# Altium footprint library micro-intel.PCBLIB: 48 footprints (part 3 of 4)
Each footprint in its own frame and in the unit in brackets; x right, y up, seen from the top. Pads: shape width x height; smd on the part's side, far side on the other; paste and mask are expansions set on the pad; w line width, h text height; cw(c..) or ccw(c..) is an arc to the next point about the centre after c.
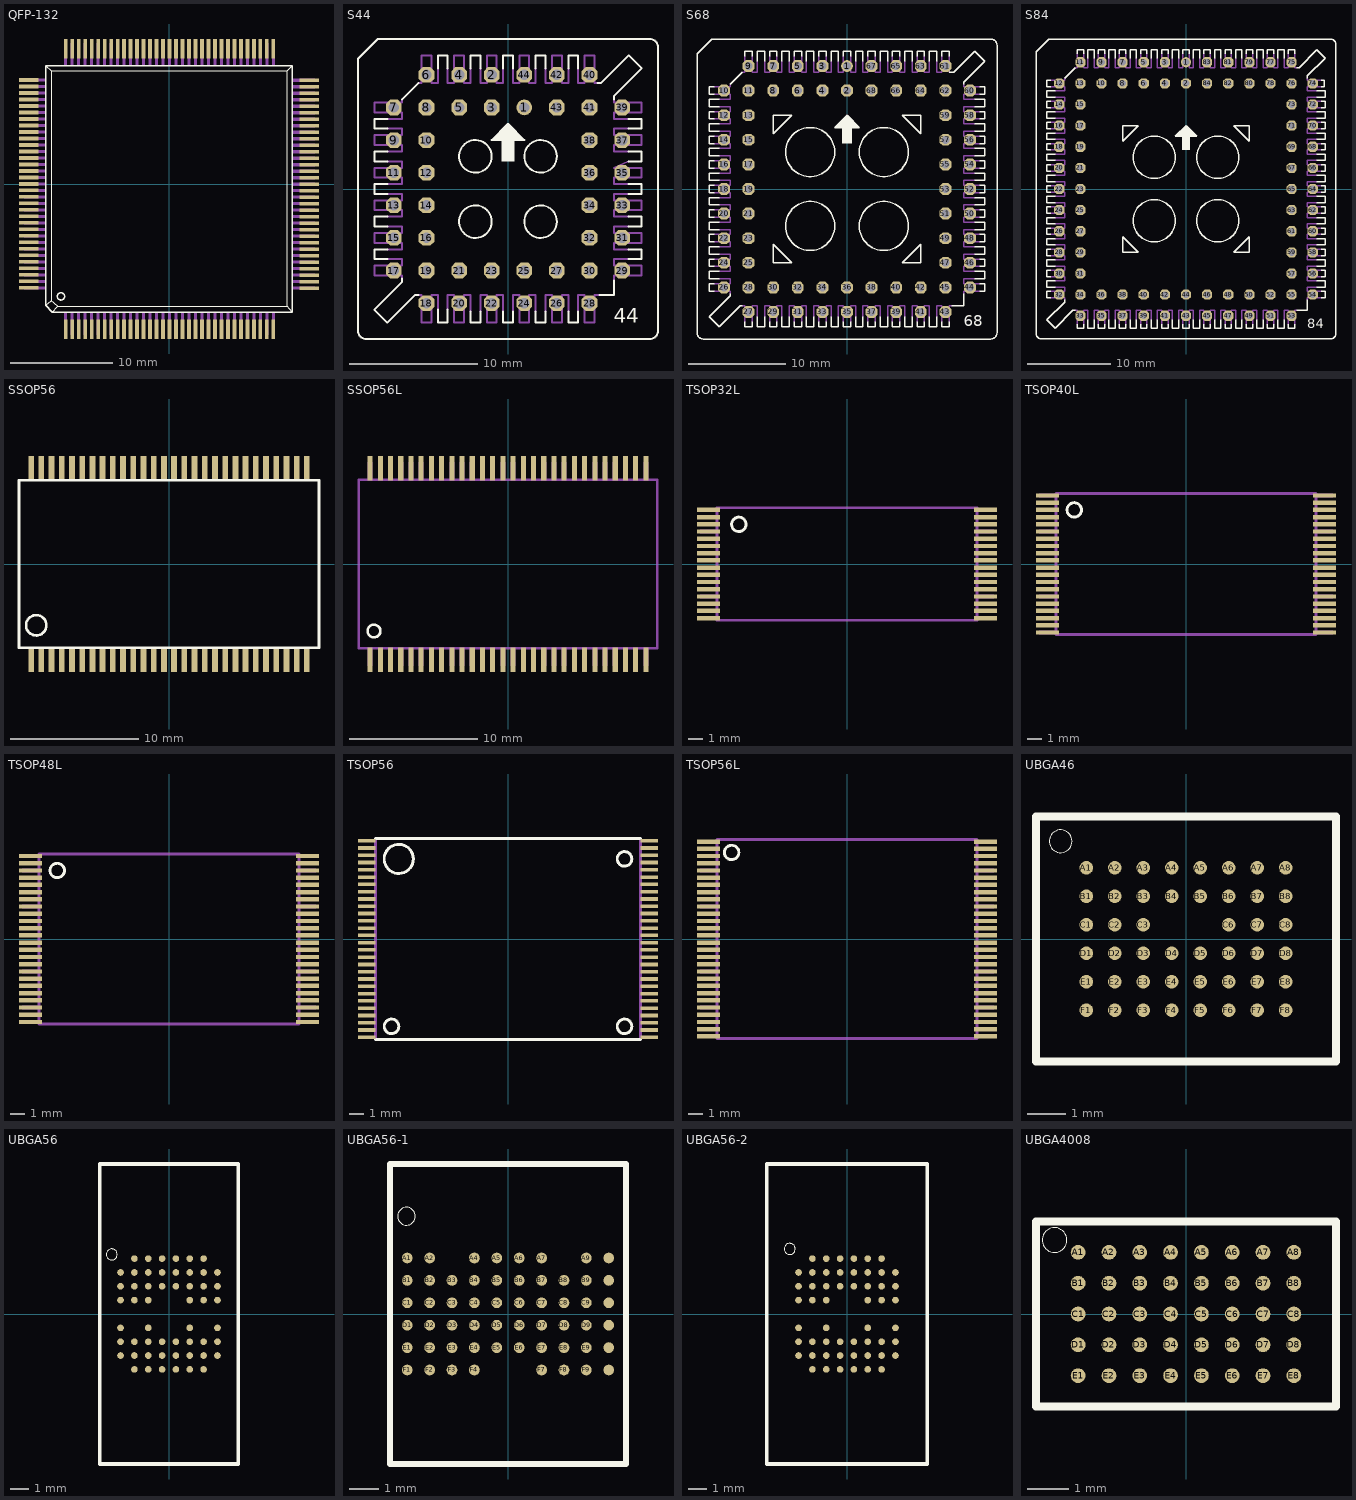
[diagram p2: the footprints below, top view; thin cyan lines are the x and y axes]

## QFP-132 [mil]
pads (132):
  rect 14x75 smd: 1(-399,-557) 2(-374,-557) 3(-349,-557) 4(-324,-557) 5(-299,-557) 6(-274,-557) 7(-249,-557) 8(-224,-557) 9(-199,-557) 10(-174,-557) 11(-149,-557) 12(-124,-557) 13(-99,-557) 14(-74,-557) 15(-49,-557) 16(-24,-557) 17(1,-557) 18(26,-557) 19(51,-557) 20(76,-557) 21(101,-557) 22(126,-557) 23(151,-557) 24(176,-557) 25(201,-557) 26(226,-557) 27(251,-557) 28(276,-557) 29(301,-557) 30(326,-557) 31(351,-557) 32(376,-557) 33(401,-557) 67(401,522) 68(376,522) 69(351,522) 70(326,522) 71(301,522) 72(276,522) 73(251,522) 74(226,522) 75(201,522) 76(176,522) 77(151,522) 78(126,522) 79(101,522) 80(76,522) 81(51,522) 82(26,522) 83(1,522) 84(-24,522) 85(-49,522) 86(-74,522) 87(-99,522) 88(-124,522) 89(-149,522) 90(-174,522) 91(-199,522) 92(-224,522) 93(-249,522) 94(-274,522) 95(-299,522) 96(-324,522) 97(-349,522) 98(-374,522) 99(-399,522)
  rect 75x14 smd: 34(539,-399) 35(539,-374) 36(539,-349) 37(539,-324) 38(539,-299) 39(539,-274) 40(539,-249) 41(539,-224) 42(539,-199) 43(539,-174) 44(539,-149) 45(539,-124) 46(539,-99) 47(539,-74) 48(539,-49) 49(539,-24) 50(539,1) 51(539,26) 52(539,51) 53(539,76) 54(539,101) 55(539,126) 56(539,151) 57(539,176) 58(539,201) 59(539,226) 60(539,251) 61(539,276) 62(539,301) 63(539,326) 64(539,351) 65(539,376) 66(539,401) 100(-541,402) 101(-541,377) 102(-541,352) 103(-541,327) 104(-541,302) 105(-541,277) 106(-541,252) 107(-541,227) 108(-541,202) 109(-541,177) 110(-541,152) 111(-541,127) 112(-541,102) 113(-541,77) 114(-541,52) 115(-541,27) 116(-541,2) 117(-541,-23) 118(-541,-48) 119(-541,-73) 120(-541,-98) 121(-541,-123) 122(-541,-148) 123(-541,-173) 124(-541,-198) 125(-541,-223) 126(-541,-248) 127(-541,-273) 128(-541,-298) 129(-541,-323) 130(-541,-348) 131(-541,-373) 132(-541,-398)
Top Overlay:
  circle w6: c-417,-431 r14
  lines w2: -475,-465 -454,-448 ; -475,457 -454,437 ; -450,-492 -430,-469 ; 474,-492 455,-469 ; 474,457 455,437 ; -454,-448 -454,437 ; -454,-448 -430,-469 ; -454,437 455,437 ; -430,-469 455,-469 ; 455,-469 455,437
  lines w6: -475,-465 -475,457 474,457 474,-492 -450,-492 -475,-465
Mechanical 16:
  rectangle: 476,395 561,407
  rectangle: 476,370 561,382
  rectangle: 476,345 561,357
  rectangle: 476,320 561,332
  rectangle: 476,295 561,307
  rectangle: 476,270 561,282
  rectangle: 476,245 561,257
  rectangle: 476,220 561,232
  rectangle: 476,195 561,207
  rectangle: 476,170 561,182
  rectangle: 476,145 561,157
  rectangle: 476,120 561,132
  rectangle: 476,95 561,107
  rectangle: 476,70 561,82
  rectangle: 476,45 561,57
  rectangle: 476,20 561,32
  rectangle: 476,-5 561,7
  rectangle: 476,-30 561,-18
  rectangle: 476,-55 561,-43
  rectangle: 476,-80 561,-68
  rectangle: 476,-105 561,-93
  rectangle: 476,-130 561,-118
  rectangle: 476,-155 561,-143
  rectangle: 476,-180 561,-168
  rectangle: 476,-205 561,-193
  rectangle: 476,-230 561,-218
  rectangle: 476,-255 561,-243
  rectangle: 476,-280 561,-268
  rectangle: 476,-305 561,-293
  rectangle: 476,-330 561,-318
  rectangle: 476,-355 561,-343
  rectangle: 476,-380 561,-368
  rectangle: 476,-405 561,-393
  rectangle: 320,459 332,544
  rectangle: 295,459 307,544
  rectangle: 270,459 282,544
  rectangle: 245,459 257,544
  rectangle: 220,459 232,544
  rectangle: 195,459 207,544
  rectangle: 170,459 182,544
  rectangle: 145,459 157,544
  rectangle: 120,459 132,544
  rectangle: 95,459 107,544
  rectangle: 70,459 82,544
  rectangle: 45,459 57,544
  rectangle: 20,459 32,544
  rectangle: -5,459 7,544
  rectangle: -30,459 -18,544
  rectangle: -55,459 -43,544
  rectangle: -80,459 -68,544
  rectangle: -105,459 -93,544
  rectangle: -130,459 -118,544
  rectangle: -155,459 -143,544
  rectangle: -180,459 -168,544
  rectangle: -205,459 -193,544
  rectangle: -230,459 -218,544
  rectangle: -255,459 -243,544
  rectangle: -280,459 -268,544
  rectangle: -305,459 -293,544
  rectangle: -330,459 -318,544
  rectangle: -355,459 -343,544
  rectangle: -380,459 -368,544
  rectangle: -405,459 -393,544
  rectangle: 345,459 357,544
  rectangle: 370,459 382,544
  rectangle: 395,459 407,544
  rectangle: -562,396 -477,408
  rectangle: -562,371 -477,383
  rectangle: -562,346 -477,358
  rectangle: -562,321 -477,333
  rectangle: -562,296 -477,308
  rectangle: -562,271 -477,283
  rectangle: -562,246 -477,258
  rectangle: -562,221 -477,233
  rectangle: -562,196 -477,208
  rectangle: -562,171 -477,183
  rectangle: -562,146 -477,158
  rectangle: -562,121 -477,133
  rectangle: -562,96 -477,108
  rectangle: -562,71 -477,83
  rectangle: -562,46 -477,58
  rectangle: -562,21 -477,33
  rectangle: -562,-4 -477,8
  rectangle: -562,-29 -477,-17
  rectangle: -562,-54 -477,-42
  rectangle: -562,-79 -477,-67
  rectangle: -562,-104 -477,-92
  rectangle: -562,-129 -477,-117
  rectangle: -562,-154 -477,-142
  rectangle: -562,-179 -477,-167
  rectangle: -562,-204 -477,-192
  rectangle: -562,-229 -477,-217
  rectangle: -562,-254 -477,-242
  rectangle: -562,-279 -477,-267
  rectangle: -562,-304 -477,-292
  rectangle: -562,-329 -477,-317
  rectangle: -562,-354 -477,-342
  rectangle: -562,-379 -477,-367
  rectangle: -562,-404 -477,-392
  rectangle: 395,-579 407,-494
  rectangle: 370,-579 382,-494
  rectangle: 345,-579 357,-494
  rectangle: 320,-579 332,-494
  rectangle: 295,-579 307,-494
  rectangle: 270,-579 282,-494
  rectangle: 245,-579 257,-494
  rectangle: 220,-579 232,-494
  rectangle: 195,-579 207,-494
  rectangle: 170,-579 182,-494
  rectangle: 145,-579 157,-494
  rectangle: 120,-579 132,-494
  rectangle: 95,-579 107,-494
  rectangle: 70,-579 82,-494
  rectangle: 45,-579 57,-494
  rectangle: 20,-579 32,-494
  rectangle: -5,-579 7,-494
  rectangle: -30,-579 -18,-494
  rectangle: -55,-579 -43,-494
  rectangle: -80,-579 -68,-494
  rectangle: -105,-579 -93,-494
  rectangle: -130,-579 -118,-494
  rectangle: -155,-579 -143,-494
  rectangle: -180,-579 -168,-494
  rectangle: -205,-579 -193,-494
  rectangle: -230,-579 -218,-494
  rectangle: -255,-579 -243,-494
  rectangle: -280,-579 -268,-494
  rectangle: -305,-579 -293,-494
  rectangle: -330,-579 -318,-494
  rectangle: -355,-579 -343,-494
  rectangle: -380,-579 -368,-494
  rectangle: -405,-579 -393,-494

## S44 [mil]
pads (44):
  round 48 hole 32: 1(50,250)
  oct 48x48 hole 32: 2(-50,350) 3(-50,250) 4(-150,350) 5(-150,250) 6(-250,350) 7(-350,250) 8(-250,250) 9(-350,150) 10(-250,150) 11(-350,50) 12(-250,50) 13(-350,-50) 14(-250,-50) 15(-350,-150) 16(-250,-150) 17(-350,-250) 18(-250,-350) 19(-250,-250) 20(-150,-350) 21(-150,-250) 22(-50,-350) 23(-50,-250) 24(50,-350) 25(50,-250) 26(150,-350) 27(150,-250) 28(250,-350) 29(350,-250) 30(250,-250) 31(350,-150) 32(250,-150) 33(350,-50) 34(250,-50) 35(350,50) 36(250,50) 37(350,150) 38(250,150) 39(350,250) 40(250,350) 41(250,250) 42(150,350) 43(150,250) 44(50,350)
Top Overlay:
  circle w6: c-100,100 r50
  circle w6: c100,100 r50
  circle w6: c-100,-100 r50
  circle w6: c100,-100 r50
  rectangle: -20,85 20,160
  rectangle: -35,150 35,165
  rectangle: -25,165 25,175
  rectangle: -15,175 15,185
  rectangle: -5,185 5,195
  rectangle: -45,150 -35,155
  rectangle: -40,155 -35,160
  rectangle: -30,165 -25,170
  rectangle: -20,175 -15,180
  rectangle: -10,185 -5,190
  rectangle: 5,185 10,190
  rectangle: 15,175 20,180
  rectangle: 25,165 30,170
  rectangle: 35,150 45,155
  rectangle: 35,155 40,160
  lines w6: -370,-215 -410,-215 -410,-185 -370,-185 ; -370,-115 -410,-115 -410,-85 -370,-85 ; -370,-15 -410,-15 -410,15 -370,15 ; -370,85 -410,85 -410,115 -370,115 ; -370,185 -410,185 -410,215 -370,215 ; -325,-275 -325,-285 -410,-370 -370,-410 -285,-325 -275,-325 ; -325,275 -275,325 ; -215,-370 -215,-410 -185,-410 -185,-370 ; -215,370 -215,410 -185,410 -185,370 ; -115,-375 -115,-410 -85,-410 -85,-375 ; -115,370 -115,410 -85,410 -85,370 ; -15,-375 -15,-410 15,-410 15,-375 ; -15,370 -15,410 15,410 15,370 ; 85,-375 85,-410 115,-410 115,-375 ; 85,370 85,410 115,410 115,370 ; 185,-375 185,-410 215,-410 215,-375 ; 185,370 185,410 215,410 215,370 ; 275,325 285,325 370,410 410,370 325,285 325,275 ; 280,-325 325,-325 325,-280 ; 370,-215 410,-215 410,-185 370,-185 ; 370,-115 410,-115 410,-85 370,-85 ; 370,-15 410,-15 410,15 370,15 ; 370,85 410,85 410,115 370,115 ; 370,185 410,185 410,215 370,215 ; -460,-435 -460,400 -400,460 435,460 cw(c435,435) 460,435 460,-435 cw(c435,-435) 435,-460 -435,-460 cw(c-435,-435) -460,-435 ; -50,150 50,150 0,200 -50,150
  text "44" at 325,-425 h77.5
Mechanical 16:
  drawing of 159 lines, arcs and shapes, not listed

## S68 [mil]
pads (68):
  round 48 hole 32: 1(0,500)
  oct 48x48 hole 32: 2(0,400) 3(-100,500) 4(-100,400) 5(-200,500) 6(-200,400) 7(-300,500) 8(-300,400) 9(-400,500) 10(-500,400) 11(-400,400) 12(-500,300) 13(-400,300) 14(-500,200) 15(-400,200) 16(-500,100) 17(-400,100) 18(-500,0) 19(-400,0) 20(-500,-100) 21(-400,-100) 22(-500,-200) 23(-400,-200) 24(-500,-300) 25(-400,-300) 26(-500,-400) 27(-400,-500) 28(-400,-400) 29(-300,-500) 30(-300,-400) 31(-200,-500) 32(-200,-400) 33(-100,-500) 34(-100,-400) 35(0,-500) 36(0,-400) 37(100,-500) 38(100,-400) 39(200,-500) 40(200,-400) 41(300,-500) 42(300,-400) 43(400,-500) 44(500,-400) 45(400,-400) 46(500,-300) 47(400,-300) 48(500,-200) 49(400,-200) 50(500,-100) 51(400,-100) 52(500,0) 53(400,0) 54(500,100) 55(400,100) 56(500,200) 57(400,200) 58(500,300) 59(400,300) 60(500,400) 61(400,500) 62(400,400) 63(300,500) 64(300,400) 65(200,500) 66(200,400) 67(100,500) 68(100,400)
Top Overlay:
  drawing of 259 lines, arcs and shapes, not listed
  text "68" at 475,-575 h77.5
Mechanical 16:
  drawing of 207 lines, arcs and shapes, not listed

## S84 [mil]
pads (84):
  round 48 hole 32: 1(0,600)
  oct 48x48 hole 32: 2(0,500) 3(-100,600) 4(-100,500) 5(-200,600) 6(-200,500) 7(-300,600) 8(-300,500) 9(-400,600) 10(-400,500) 11(-500,600) 12(-600,500) 13(-500,500) 14(-600,400) 15(-500,400) 16(-600,300) 17(-500,300) 18(-600,200) 19(-500,200) 20(-600,100) 21(-500,100) 22(-600,0) 23(-500,0) 24(-600,-100) 25(-500,-100) 26(-600,-200) 27(-500,-200) 28(-600,-300) 29(-500,-300) 30(-600,-400) 31(-500,-400) 32(-600,-500) 33(-500,-600) 34(-500,-500) 35(-400,-600) 36(-400,-500) 37(-300,-600) 38(-300,-500) 39(-200,-600) 40(-200,-500) 41(-100,-600) 42(-100,-500) 43(0,-600) 44(0,-500) 45(100,-600) 46(100,-500) 47(200,-600) 48(200,-500) 49(300,-600) 50(300,-500) 51(400,-600) 52(400,-500) 53(500,-600) 54(600,-500) 55(500,-500) 56(600,-400) 57(500,-400) 58(600,-300) 59(500,-300) 60(600,-200) 61(500,-200) 62(600,-100) 63(500,-100) 64(600,0) 65(500,0) 66(600,100) 67(500,100) 68(600,200) 69(500,200) 70(600,300) 71(500,300) 72(600,400) 73(500,400) 74(600,500) 75(500,600) 76(500,500) 77(400,600) 78(400,500) 79(300,600) 80(300,500) 81(200,600) 82(200,500) 83(100,600) 84(100,500)
Top Overlay:
  drawing of 307 lines, arcs and shapes, not listed
  text "84" at 575,-675 h77.5
Mechanical 16:
  drawing of 256 lines, arcs and shapes, not listed

## SSOP56 [mm]
pads (56):
  rect 0.45x1.8 smd: 1(-10.8,-7.55) 2(-10,-7.55) 3(-9.2,-7.55) 4(-8.4,-7.55) 5(-7.6,-7.55) 6(-6.8,-7.55) 7(-6,-7.55) 8(-5.2,-7.55) 9(-4.4,-7.55) 10(-3.6,-7.55) 11(-2.8,-7.55) 12(-2,-7.55) 13(-1.2,-7.55) 14(-0.4,-7.55) 15(0.4,-7.55) 16(1.2,-7.55) 17(2,-7.55) 18(2.8,-7.55) 19(3.6,-7.55) 20(4.4,-7.55) 21(5.2,-7.55) 22(6,-7.55) 23(6.8,-7.55) 24(7.6,-7.55) 25(8.4,-7.55) 26(9.2,-7.55) 27(10,-7.55) 28(10.8,-7.55) 29(10.8,7.55) 30(10,7.55) 31(9.2,7.55) 32(8.4,7.55) 33(7.6,7.55) 34(6.8,7.55) 35(6,7.55) 36(5.2,7.55) 37(4.4,7.55) 38(3.6,7.55) 39(2.8,7.55) 40(2,7.55) 41(1.2,7.55) 42(0.4,7.55) 43(-0.4,7.55) 44(-1.2,7.55) 45(-2,7.55) 46(-2.8,7.55) 47(-3.6,7.55) 48(-4.4,7.55) 49(-5.2,7.55) 50(-6,7.55) 51(-6.8,7.55) 52(-7.6,7.55) 53(-8.4,7.55) 54(-9.2,7.55) 55(-10,7.55) 56(-10.8,7.55)
Top Overlay:
  circle w0.203: c-10.4,-4.8 r0.8
  lines w0.203: -11.75,-6.55 11.75,-6.55 11.75,6.55 -11.75,6.55 -11.75,-6.55
Mechanical 16:
  rectangle: -10.95,-8 -10.65,-6.6
  rectangle: -10.15,-8 -9.85,-6.6
  rectangle: -9.35,-8 -9.05,-6.6
  rectangle: -8.55,-8 -8.25,-6.6
  rectangle: -7.75,-8 -7.45,-6.6
  rectangle: -6.95,-8 -6.65,-6.6
  rectangle: -6.15,-8 -5.85,-6.6
  rectangle: -5.35,-8 -5.05,-6.6
  rectangle: -4.55,-8 -4.25,-6.6
  rectangle: -3.75,-8 -3.45,-6.6
  rectangle: -2.95,-8 -2.65,-6.6
  rectangle: -2.15,-8 -1.85,-6.6
  rectangle: -1.35,-8 -1.05,-6.6
  rectangle: -0.55,-8 -0.25,-6.6
  rectangle: 0.25,-8 0.55,-6.6
  rectangle: 1.05,-8 1.35,-6.6
  rectangle: 1.85,-8 2.15,-6.6
  rectangle: 2.65,-8 2.95,-6.6
  rectangle: 3.45,-8 3.75,-6.6
  rectangle: 4.25,-8 4.55,-6.6
  rectangle: 5.05,-8 5.35,-6.6
  rectangle: 5.85,-8 6.15,-6.6
  rectangle: 6.65,-8 6.95,-6.6
  rectangle: 7.45,-8 7.75,-6.6
  rectangle: 8.25,-8 8.55,-6.6
  rectangle: 9.05,-8 9.35,-6.6
  rectangle: 9.85,-8 10.15,-6.6
  rectangle: 10.65,-8 10.95,-6.6
  rectangle: 10.65,6.6 10.95,8
  rectangle: 9.85,6.6 10.15,8
  rectangle: 9.05,6.6 9.35,8
  rectangle: 8.25,6.6 8.55,8
  rectangle: 7.45,6.6 7.75,8
  rectangle: 6.65,6.6 6.95,8
  rectangle: 5.85,6.6 6.15,8
  rectangle: 5.05,6.6 5.35,8
  rectangle: 4.25,6.6 4.55,8
  rectangle: 3.45,6.6 3.75,8
  rectangle: 2.65,6.6 2.95,8
  rectangle: 1.85,6.6 2.15,8
  rectangle: 1.05,6.6 1.35,8
  rectangle: 0.25,6.6 0.55,8
  rectangle: -0.55,6.6 -0.25,8
  rectangle: -1.35,6.6 -1.05,8
  rectangle: -2.15,6.6 -1.85,8
  rectangle: -2.95,6.6 -2.65,8
  rectangle: -3.75,6.6 -3.45,8
  rectangle: -4.55,6.6 -4.25,8
  rectangle: -5.35,6.6 -5.05,8
  rectangle: -6.15,6.6 -5.85,8
  rectangle: -6.95,6.6 -6.65,8
  rectangle: -7.75,6.6 -7.45,8
  rectangle: -8.55,6.6 -8.25,8
  rectangle: -9.35,6.6 -9.05,8
  rectangle: -10.15,6.6 -9.85,8
  rectangle: -10.95,6.6 -10.65,8

## SSOP56L [mm]
pads (56):
  rect 0.4x1.9 smd: 1(-10.8,-7.5) 2(-10,-7.5) 3(-9.2,-7.5) 4(-8.4,-7.5) 5(-7.6,-7.5) 6(-6.8,-7.5) 7(-6,-7.5) 8(-5.2,-7.5) 9(-4.4,-7.5) 10(-3.6,-7.5) 11(-2.8,-7.5) 12(-2,-7.5) 13(-1.2,-7.5) 14(-0.4,-7.5) 15(0.4,-7.5) 16(1.2,-7.5) 17(2,-7.5) 18(2.8,-7.5) 19(3.6,-7.5) 20(4.4,-7.5) 21(5.2,-7.5) 22(6,-7.5) 23(6.8,-7.5) 24(7.6,-7.5) 25(8.4,-7.5) 26(9.2,-7.5) 27(10,-7.5) 28(10.8,-7.5) 29(10.8,7.5) 30(10,7.5) 31(9.2,7.5) 32(8.4,7.5) 33(7.6,7.5) 34(6.8,7.5) 35(6,7.5) 36(5.2,7.5) 37(4.4,7.5) 38(3.6,7.5) 39(2.8,7.5) 40(2,7.5) 41(1.2,7.5) 42(0.4,7.5) 43(-0.4,7.5) 44(-1.2,7.5) 45(-2,7.5) 46(-2.8,7.5) 47(-3.6,7.5) 48(-4.4,7.5) 49(-5.2,7.5) 50(-6,7.5) 51(-6.8,7.5) 52(-7.6,7.5) 53(-8.4,7.5) 54(-9.2,7.5) 55(-10,7.5) 56(-10.8,7.5)
Top Overlay:
  circle w0.203: c-10.5,-5.25 r0.5
Mechanical 16:
  rectangle: -11,-8 -10.6,-6.6
  rectangle: -10.2,-8 -9.8,-6.6
  rectangle: -9.4,-8 -9,-6.6
  rectangle: -8.6,-8 -8.2,-6.6
  rectangle: -7.8,-8 -7.4,-6.6
  rectangle: -7,-8 -6.6,-6.6
  rectangle: -6.2,-8 -5.8,-6.6
  rectangle: -5.4,-8 -5,-6.6
  rectangle: -4.6,-8 -4.2,-6.6
  rectangle: -3.8,-8 -3.4,-6.6
  rectangle: -3,-8 -2.6,-6.6
  rectangle: -2.2,-8 -1.8,-6.6
  rectangle: -1.4,-8 -1,-6.6
  rectangle: -0.6,-8 -0.2,-6.6
  rectangle: 0.2,-8 0.6,-6.6
  rectangle: 1,-8 1.4,-6.6
  rectangle: 1.8,-8 2.2,-6.6
  rectangle: 2.6,-8 3,-6.6
  rectangle: 3.4,-8 3.8,-6.6
  rectangle: 4.2,-8 4.6,-6.6
  rectangle: 5,-8 5.4,-6.6
  rectangle: 5.8,-8 6.2,-6.6
  rectangle: 6.6,-8 7,-6.6
  rectangle: 7.4,-8 7.8,-6.6
  rectangle: 8.2,-8 8.6,-6.6
  rectangle: 9,-8 9.4,-6.6
  rectangle: 9.8,-8 10.2,-6.6
  rectangle: 10.6,-8 11,-6.6
  rectangle: 10.6,6.6 11,8
  rectangle: 9.8,6.6 10.2,8
  rectangle: 9,6.6 9.4,8
  rectangle: 8.2,6.6 8.6,8
  rectangle: 7.4,6.6 7.8,8
  rectangle: 6.6,6.6 7,8
  rectangle: 5.8,6.6 6.2,8
  rectangle: 5,6.6 5.4,8
  rectangle: 4.2,6.6 4.6,8
  rectangle: 3.4,6.6 3.8,8
  rectangle: 2.6,6.6 3,8
  rectangle: 1.8,6.6 2.2,8
  rectangle: 1,6.6 1.4,8
  rectangle: 0.2,6.6 0.6,8
  rectangle: -0.6,6.6 -0.2,8
  rectangle: -1.4,6.6 -1,8
  rectangle: -2.2,6.6 -1.8,8
  rectangle: -3,6.6 -2.6,8
  rectangle: -3.8,6.6 -3.4,8
  rectangle: -4.6,6.6 -4.2,8
  rectangle: -5.4,6.6 -5,8
  rectangle: -6.2,6.6 -5.8,8
  rectangle: -7,6.6 -6.6,8
  rectangle: -7.8,6.6 -7.4,8
  rectangle: -8.6,6.6 -8.2,8
  rectangle: -9.4,6.6 -9,8
  rectangle: -10.2,6.6 -9.8,8
  rectangle: -11,6.6 -10.6,8
  lines w0.203: -11.7,-6.6 -11.7,6.6 11.7,6.6 11.7,-6.6 -11.7,-6.6

## TSOP32L [mil]
pads (32):
  rect 62.99x11.81 smd: 1(-377.95,147.64) 2(-377.95,127.95) 3(-377.95,108.27) 4(-377.95,88.58) 5(-377.95,68.9) 6(-377.95,49.21) 7(-377.95,29.53) 8(-377.95,9.84) 9(-377.95,-9.84) 10(-377.95,-29.53) 11(-377.95,-49.21) 12(-377.95,-68.9) 13(-377.95,-88.58) 14(-377.95,-108.27) 15(-377.95,-127.95) 16(-377.95,-147.64) 17(377.95,-147.64) 18(377.95,-127.95) 19(377.95,-108.27) 20(377.95,-88.58) 21(377.95,-68.9) 22(377.95,-49.21) 23(377.95,-29.53) 24(377.95,-9.84) 25(377.95,9.84) 26(377.95,29.53) 27(377.95,49.21) 28(377.95,68.9) 29(377.95,88.58) 30(377.95,108.27) 31(377.95,127.95) 32(377.95,147.64)
Top Overlay:
  circle w8: c-295.28,108.27 r19.69
Mechanical 16:
  rectangle: -401.57,142.72 -357.28,152.56
  rectangle: -401.57,123.03 -357.28,132.87
  rectangle: -401.57,103.35 -357.28,113.19
  rectangle: -401.57,83.66 -357.28,93.5
  rectangle: -401.57,63.98 -357.28,73.82
  rectangle: -401.57,44.29 -357.28,54.13
  rectangle: -401.57,24.61 -357.28,34.45
  rectangle: -401.57,4.92 -357.28,14.76
  rectangle: -401.57,-14.76 -357.28,-4.92
  rectangle: -401.57,-34.45 -357.28,-24.61
  rectangle: -401.57,-54.13 -357.28,-44.29
  rectangle: -401.57,-73.82 -357.28,-63.98
  rectangle: -401.57,-93.5 -357.28,-83.66
  rectangle: -401.57,-113.19 -357.28,-103.35
  rectangle: -401.57,-132.87 -357.28,-123.03
  rectangle: -401.57,-152.56 -357.28,-142.72
  rectangle: 357.28,-152.56 401.57,-142.72
  rectangle: 357.28,-132.87 401.57,-123.03
  rectangle: 357.28,-113.19 401.57,-103.35
  rectangle: 357.28,-93.5 401.57,-83.66
  rectangle: 357.28,-73.82 401.57,-63.98
  rectangle: 357.28,-54.13 401.57,-44.29
  rectangle: 357.28,-34.45 401.57,-24.61
  rectangle: 357.28,-14.76 401.57,-4.92
  rectangle: 357.28,4.92 401.57,14.76
  rectangle: 357.28,24.61 401.57,34.45
  rectangle: 357.28,44.29 401.57,54.13
  rectangle: 357.28,63.98 401.57,73.82
  rectangle: 357.28,83.66 401.57,93.5
  rectangle: 357.28,103.35 401.57,113.19
  rectangle: 357.28,123.03 401.57,132.87
  rectangle: 357.28,142.72 401.57,152.56
  lines w8: -354.33,-153.54 354.33,-153.54 354.33,153.54 -354.33,153.54 -354.33,-153.54

## TSOP40L [mil]
pads (40):
  rect 62.99x11.81 smd: 1(-377.95,187.01) 2(-377.95,167.32) 3(-377.95,147.64) 4(-377.95,127.95) 5(-377.95,108.27) 6(-377.95,88.58) 7(-377.95,68.9) 8(-377.95,49.21) 9(-377.95,29.53) 10(-377.95,9.84) 11(-377.95,-9.84) 12(-377.95,-29.53) 13(-377.95,-49.21) 14(-377.95,-68.9) 15(-377.95,-88.58) 16(-377.95,-108.27) 17(-377.95,-127.95) 18(-377.95,-147.64) 19(-377.95,-167.32) 20(-377.95,-187.01) 21(377.95,-187.01) 22(377.95,-167.32) 23(377.95,-147.64) 24(377.95,-127.95) 25(377.95,-108.27) 26(377.95,-88.58) 27(377.95,-68.9) 28(377.95,-49.21) 29(377.95,-29.53) 30(377.95,-9.84) 31(377.95,9.84) 32(377.95,29.53) 33(377.95,49.21) 34(377.95,68.9) 35(377.95,88.58) 36(377.95,108.27) 37(377.95,127.95) 38(377.95,147.64) 39(377.95,167.32) 40(377.95,187.01)
Top Overlay:
  circle w8: c-305.12,147.64 r19.69
Mechanical 16:
  rectangle: -401.57,182.09 -357.28,191.93
  rectangle: -401.57,162.4 -357.28,172.24
  rectangle: -401.57,142.72 -357.28,152.56
  rectangle: -401.57,123.03 -357.28,132.87
  rectangle: -401.57,103.35 -357.28,113.19
  rectangle: -401.57,83.66 -357.28,93.5
  rectangle: -401.57,63.98 -357.28,73.82
  rectangle: -401.57,44.29 -357.28,54.13
  rectangle: -401.57,24.61 -357.28,34.45
  rectangle: -401.57,4.92 -357.28,14.76
  rectangle: -401.57,-14.76 -357.28,-4.92
  rectangle: -401.57,-34.45 -357.28,-24.61
  rectangle: -401.57,-54.13 -357.28,-44.29
  rectangle: -401.57,-73.82 -357.28,-63.98
  rectangle: -401.57,-93.5 -357.28,-83.66
  rectangle: -401.57,-113.19 -357.28,-103.35
  rectangle: -401.57,-132.87 -357.28,-123.03
  rectangle: -401.57,-152.56 -357.28,-142.72
  rectangle: -401.57,-172.24 -357.28,-162.4
  rectangle: -401.57,-191.93 -357.28,-182.09
  rectangle: 357.28,-191.93 401.57,-182.09
  rectangle: 357.28,-172.24 401.57,-162.4
  rectangle: 357.28,-152.56 401.57,-142.72
  rectangle: 357.28,-132.87 401.57,-123.03
  rectangle: 357.28,-113.19 401.57,-103.35
  rectangle: 357.28,-93.5 401.57,-83.66
  rectangle: 357.28,-73.82 401.57,-63.98
  rectangle: 357.28,-54.13 401.57,-44.29
  rectangle: 357.28,-34.45 401.57,-24.61
  rectangle: 357.28,-14.76 401.57,-4.92
  rectangle: 357.28,4.92 401.57,14.76
  rectangle: 357.28,24.61 401.57,34.45
  rectangle: 357.28,44.29 401.57,54.13
  rectangle: 357.28,63.98 401.57,73.82
  rectangle: 357.28,83.66 401.57,93.5
  rectangle: 357.28,103.35 401.57,113.19
  rectangle: 357.28,123.03 401.57,132.87
  rectangle: 357.28,142.72 401.57,152.56
  rectangle: 357.28,162.4 401.57,172.24
  rectangle: 357.28,182.09 401.57,191.93
  lines w8: -354.33,-192.91 354.33,-192.91 354.33,192.91 -354.33,192.91 -354.33,-192.91

## TSOP48L [mil]
pads (48):
  rect 62.99x11.81 smd: 1(-377.95,226.38) 2(-377.95,206.69) 3(-377.95,187.01) 4(-377.95,167.32) 5(-377.95,147.64) 6(-377.95,127.95) 7(-377.95,108.27) 8(-377.95,88.58) 9(-377.95,68.9) 10(-377.95,49.21) 11(-377.95,29.53) 12(-377.95,9.84) 13(-377.95,-9.84) 14(-377.95,-29.53) 15(-377.95,-49.21) 16(-377.95,-68.9) 17(-377.95,-88.58) 18(-377.95,-108.27) 19(-377.95,-127.95) 20(-377.95,-147.64) 21(-377.95,-167.32) 22(-377.95,-187.01) 23(-377.95,-206.69) 24(-377.95,-226.38) 25(377.95,-226.38) 26(377.95,-206.69) 27(377.95,-187.01) 28(377.95,-167.32) 29(377.95,-147.64) 30(377.95,-127.95) 31(377.95,-108.27) 32(377.95,-88.58) 33(377.95,-68.9) 34(377.95,-49.21) 35(377.95,-29.53) 36(377.95,-9.84) 37(377.95,9.84) 38(377.95,29.53) 39(377.95,49.21) 40(377.95,68.9) 41(377.95,88.58) 42(377.95,108.27) 43(377.95,127.95) 44(377.95,147.64) 45(377.95,167.32) 46(377.95,187.01) 47(377.95,206.69) 48(377.95,226.38)
Top Overlay:
  circle w8: c-305.12,187.01 r19.69
Mechanical 16:
  rectangle: -401.57,221.46 -357.28,231.3
  rectangle: -401.57,201.77 -357.28,211.61
  rectangle: -401.57,182.09 -357.28,191.93
  rectangle: -401.57,162.4 -357.28,172.24
  rectangle: -401.57,142.72 -357.28,152.56
  rectangle: -401.57,123.03 -357.28,132.87
  rectangle: -401.57,103.35 -357.28,113.19
  rectangle: -401.57,83.66 -357.28,93.5
  rectangle: -401.57,63.98 -357.28,73.82
  rectangle: -401.57,44.29 -357.28,54.13
  rectangle: -401.57,24.61 -357.28,34.45
  rectangle: -401.57,4.92 -357.28,14.76
  rectangle: -401.57,-14.76 -357.28,-4.92
  rectangle: -401.57,-34.45 -357.28,-24.61
  rectangle: -401.57,-54.13 -357.28,-44.29
  rectangle: -401.57,-73.82 -357.28,-63.98
  rectangle: -401.57,-93.5 -357.28,-83.66
  rectangle: -401.57,-113.19 -357.28,-103.35
  rectangle: -401.57,-132.87 -357.28,-123.03
  rectangle: -401.57,-152.56 -357.28,-142.72
  rectangle: -401.57,-172.24 -357.28,-162.4
  rectangle: -401.57,-191.93 -357.28,-182.09
  rectangle: -401.57,-211.61 -357.28,-201.77
  rectangle: -401.57,-231.3 -357.28,-221.46
  rectangle: 357.28,-231.3 401.57,-221.46
  rectangle: 357.28,-211.61 401.57,-201.77
  rectangle: 357.28,-191.93 401.57,-182.09
  rectangle: 357.28,-172.24 401.57,-162.4
  rectangle: 357.28,-152.56 401.57,-142.72
  rectangle: 357.28,-132.87 401.57,-123.03
  rectangle: 357.28,-113.19 401.57,-103.35
  rectangle: 357.28,-93.5 401.57,-83.66
  rectangle: 357.28,-73.82 401.57,-63.98
  rectangle: 357.28,-54.13 401.57,-44.29
  rectangle: 357.28,-34.45 401.57,-24.61
  rectangle: 357.28,-14.76 401.57,-4.92
  rectangle: 357.28,4.92 401.57,14.76
  rectangle: 357.28,24.61 401.57,34.45
  rectangle: 357.28,44.29 401.57,54.13
  rectangle: 357.28,63.98 401.57,73.82
  rectangle: 357.28,83.66 401.57,93.5
  rectangle: 357.28,103.35 401.57,113.19
  rectangle: 357.28,123.03 401.57,132.87
  rectangle: 357.28,142.72 401.57,152.56
  rectangle: 357.28,162.4 401.57,172.24
  rectangle: 357.28,182.09 401.57,191.93
  rectangle: 357.28,201.77 401.57,211.61
  rectangle: 357.28,221.46 401.57,231.3
  lines w8: -354.33,-232.28 354.33,-232.28 354.33,232.28 -354.33,232.28 -354.33,-232.28

## TSOP56 [mm]
pads (56):
  rect 1.2x0.25 smd: 1(-9.7,6.75) 2(-9.7,6.25) 3(-9.7,5.75) 4(-9.7,5.25) 5(-9.7,4.75) 6(-9.7,4.25) 7(-9.7,3.75) 8(-9.7,3.25) 9(-9.7,2.75) 10(-9.7,2.25) 11(-9.7,1.75) 12(-9.7,1.25) 13(-9.7,0.75) 14(-9.7,0.25) 15(-9.7,-0.25) 16(-9.7,-0.75) 17(-9.7,-1.25) 18(-9.7,-1.75) 19(-9.7,-2.25) 20(-9.7,-2.75) 21(-9.7,-3.25) 22(-9.7,-3.75) 23(-9.7,-4.25) 24(-9.7,-4.75) 25(-9.7,-5.25) 26(-9.7,-5.75) 27(-9.7,-6.25) 28(-9.7,-6.75) 29(9.7,-6.75) 30(9.7,-6.25) 31(9.7,-5.75) 32(9.7,-5.25) 33(9.7,-4.75) 34(9.7,-4.25) 35(9.7,-3.75) 36(9.7,-3.25) 37(9.7,-2.75) 38(9.7,-2.25) 39(9.7,-1.75) 40(9.7,-1.25) 41(9.7,-0.75) 42(9.7,-0.25) 43(9.7,0.25) 44(9.7,0.75) 45(9.7,1.25) 46(9.7,1.75) 47(9.7,2.25) 48(9.7,2.75) 49(9.7,3.25) 50(9.7,3.75) 51(9.7,4.25) 52(9.7,4.75) 53(9.7,5.25) 54(9.7,5.75) 55(9.7,6.25) 56(9.7,6.75)
Top Overlay:
  circle w0.203: c-7.5,5.5 r1
  circle w0.203: c-8,-6 r0.5
  circle w0.203: c8,-6 r0.5
  circle w0.203: c8,5.5 r0.5
  lines w0.203: -9.1,-6.9 9.1,-6.9 ; -9.1,6.9 9.1,6.9
Mechanical 16:
  rectangle: -10,6.675 -9.175,6.825
  rectangle: -10,6.175 -9.175,6.325
  rectangle: -10,5.675 -9.175,5.825
  rectangle: -10,5.175 -9.175,5.325
  rectangle: -10,4.675 -9.175,4.825
  rectangle: -10,4.175 -9.175,4.325
  rectangle: -10,3.675 -9.175,3.825
  rectangle: -10,3.175 -9.175,3.325
  rectangle: -10,2.675 -9.175,2.825
  rectangle: -10,2.175 -9.175,2.325
  rectangle: -10,1.675 -9.175,1.825
  rectangle: -10,1.175 -9.175,1.325
  rectangle: -10,0.675 -9.175,0.825
  rectangle: -10,0.175 -9.175,0.325
  rectangle: -10,-0.325 -9.175,-0.175
  rectangle: -10,-0.825 -9.175,-0.675
  rectangle: -10,-1.325 -9.175,-1.175
  rectangle: -10,-1.825 -9.175,-1.675
  rectangle: -10,-2.325 -9.175,-2.175
  rectangle: -10,-2.825 -9.175,-2.675
  rectangle: -10,-3.325 -9.175,-3.175
  rectangle: -10,-3.825 -9.175,-3.675
  rectangle: -10,-4.325 -9.175,-4.175
  rectangle: -10,-4.825 -9.175,-4.675
  rectangle: -10,-5.325 -9.175,-5.175
  rectangle: -10,-5.825 -9.175,-5.675
  rectangle: -10,-6.325 -9.175,-6.175
  rectangle: -10,-6.825 -9.175,-6.675
  rectangle: 9.175,-6.825 10,-6.675
  rectangle: 9.175,-6.325 10,-6.175
  rectangle: 9.175,-5.825 10,-5.675
  rectangle: 9.175,-5.325 10,-5.175
  rectangle: 9.175,-4.825 10,-4.675
  rectangle: 9.175,-4.325 10,-4.175
  rectangle: 9.175,-3.825 10,-3.675
  rectangle: 9.175,-3.325 10,-3.175
  rectangle: 9.175,-2.825 10,-2.675
  rectangle: 9.175,-2.325 10,-2.175
  rectangle: 9.175,-1.825 10,-1.675
  rectangle: 9.175,-1.325 10,-1.175
  rectangle: 9.175,-0.825 10,-0.675
  rectangle: 9.175,-0.325 10,-0.175
  rectangle: 9.175,0.175 10,0.325
  rectangle: 9.175,0.675 10,0.825
  rectangle: 9.175,1.175 10,1.325
  rectangle: 9.175,1.675 10,1.825
  rectangle: 9.175,2.175 10,2.325
  rectangle: 9.175,2.675 10,2.825
  rectangle: 9.175,3.175 10,3.325
  rectangle: 9.175,3.675 10,3.825
  rectangle: 9.175,4.175 10,4.325
  rectangle: 9.175,4.675 10,4.825
  rectangle: 9.175,5.175 10,5.325
  rectangle: 9.175,5.675 10,5.825
  rectangle: 9.175,6.175 10,6.325
  rectangle: 9.175,6.675 10,6.825
  lines w0.203: -9.1,-6.9 -9.1,6.9 ; 9.1,-6.9 9.1,6.9

## TSOP56L [mil]
pads (56):
  rect 62.99x11.81 smd: 1(-377.95,265.75) 2(-377.95,246.06) 3(-377.95,226.38) 4(-377.95,206.69) 5(-377.95,187.01) 6(-377.95,167.32) 7(-377.95,147.64) 8(-377.95,127.95) 9(-377.95,108.27) 10(-377.95,88.58) 11(-377.95,68.9) 12(-377.95,49.21) 13(-377.95,29.53) 14(-377.95,9.84) 15(-377.95,-9.84) 16(-377.95,-29.53) 17(-377.95,-49.21) 18(-377.95,-68.9) 19(-377.95,-88.58) 20(-377.95,-108.27) 21(-377.95,-127.95) 22(-377.95,-147.64) 23(-377.95,-167.32) 24(-377.95,-187.01) 25(-377.95,-206.69) 26(-377.95,-226.38) 27(-377.95,-246.06) 28(-377.95,-265.75) 29(377.95,-265.75) 30(377.95,-246.06) 31(377.95,-226.38) 32(377.95,-206.69) 33(377.95,-187.01) 34(377.95,-167.32) 35(377.95,-147.64) 36(377.95,-127.95) 37(377.95,-108.27) 38(377.95,-88.58) 39(377.95,-68.9) 40(377.95,-49.21) 41(377.95,-29.53) 42(377.95,-9.84) 43(377.95,9.84) 44(377.95,29.53) 45(377.95,49.21) 46(377.95,68.9) 47(377.95,88.58) 48(377.95,108.27) 49(377.95,127.95) 50(377.95,147.64) 51(377.95,167.32) 52(377.95,187.01) 53(377.95,206.69) 54(377.95,226.38) 55(377.95,246.06) 56(377.95,265.75)
Top Overlay:
  circle w8: c-314.96,236.22 r19.69
Mechanical 16:
  rectangle: -401.57,260.83 -357.28,270.67
  rectangle: -401.57,241.14 -357.28,250.98
  rectangle: -401.57,221.46 -357.28,231.3
  rectangle: -401.57,201.77 -357.28,211.61
  rectangle: -401.57,182.09 -357.28,191.93
  rectangle: -401.57,162.4 -357.28,172.24
  rectangle: -401.57,142.72 -357.28,152.56
  rectangle: -401.57,123.03 -357.28,132.87
  rectangle: -401.57,103.35 -357.28,113.19
  rectangle: -401.57,83.66 -357.28,93.5
  rectangle: -401.57,63.98 -357.28,73.82
  rectangle: -401.57,44.29 -357.28,54.13
  rectangle: -401.57,24.61 -357.28,34.45
  rectangle: -401.57,4.92 -357.28,14.76
  rectangle: -401.57,-14.76 -357.28,-4.92
  rectangle: -401.57,-34.45 -357.28,-24.61
  rectangle: -401.57,-54.13 -357.28,-44.29
  rectangle: -401.57,-73.82 -357.28,-63.98
  rectangle: -401.57,-93.5 -357.28,-83.66
  rectangle: -401.57,-113.19 -357.28,-103.35
  rectangle: -401.57,-132.87 -357.28,-123.03
  rectangle: -401.57,-152.56 -357.28,-142.72
  rectangle: -401.57,-172.24 -357.28,-162.4
  rectangle: -401.57,-191.93 -357.28,-182.09
  rectangle: -401.57,-211.61 -357.28,-201.77
  rectangle: -401.57,-231.3 -357.28,-221.46
  rectangle: -401.57,-250.98 -357.28,-241.14
  rectangle: -401.57,-270.67 -357.28,-260.83
  rectangle: 357.28,-270.67 401.57,-260.83
  rectangle: 357.28,-250.98 401.57,-241.14
  rectangle: 357.28,-231.3 401.57,-221.46
  rectangle: 357.28,-211.61 401.57,-201.77
  rectangle: 357.28,-191.93 401.57,-182.09
  rectangle: 357.28,-172.24 401.57,-162.4
  rectangle: 357.28,-152.56 401.57,-142.72
  rectangle: 357.28,-132.87 401.57,-123.03
  rectangle: 357.28,-113.19 401.57,-103.35
  rectangle: 357.28,-93.5 401.57,-83.66
  rectangle: 357.28,-73.82 401.57,-63.98
  rectangle: 357.28,-54.13 401.57,-44.29
  rectangle: 357.28,-34.45 401.57,-24.61
  rectangle: 357.28,-14.76 401.57,-4.92
  rectangle: 357.28,4.92 401.57,14.76
  rectangle: 357.28,24.61 401.57,34.45
  rectangle: 357.28,44.29 401.57,54.13
  rectangle: 357.28,63.98 401.57,73.82
  rectangle: 357.28,83.66 401.57,93.5
  rectangle: 357.28,103.35 401.57,113.19
  rectangle: 357.28,123.03 401.57,132.87
  rectangle: 357.28,142.72 401.57,152.56
  rectangle: 357.28,162.4 401.57,172.24
  rectangle: 357.28,182.09 401.57,191.93
  rectangle: 357.28,201.77 401.57,211.61
  rectangle: 357.28,221.46 401.57,231.3
  rectangle: 357.28,241.14 401.57,250.98
  rectangle: 357.28,260.83 401.57,270.67
  lines w8: -354.33,-271.65 354.33,-271.65 354.33,271.65 -354.33,271.65 -354.33,-271.65

## UBGA46 [mil]
pads (46):
  rrect100% 14.17x14.17 smd: A1(-103.35,73.82) A2(-73.82,73.82) A3(-44.29,73.82) A4(-14.76,73.82) A5(14.76,73.82) A6(44.29,73.82) A7(73.82,73.82) A8(103.35,73.82) B1(-103.35,44.29) B2(-73.82,44.29) B3(-44.29,44.29) B4(-14.76,44.29) B5(14.76,44.29) B6(44.29,44.29) B7(73.82,44.29) B8(103.35,44.29) C1(-103.35,14.76) C2(-73.82,14.76) C3(-44.29,14.76) C6(44.29,14.76) C7(73.82,14.76) C8(103.35,14.76) D1(-103.35,-14.76) D2(-73.82,-14.76) D3(-44.29,-14.76) D4(-14.76,-14.76) D5(14.76,-14.76) D6(44.29,-14.76) D7(73.82,-14.76) D8(103.35,-14.76) E1(-103.35,-44.29) E2(-73.82,-44.29) E3(-44.29,-44.29) E4(-14.76,-44.29) E5(14.76,-44.29) E6(44.29,-44.29) E7(73.82,-44.29) E8(103.35,-44.29) F1(-103.35,-73.82) F2(-73.82,-73.82) F3(-44.29,-73.82) F4(-14.76,-73.82) F5(14.76,-73.82) F6(44.29,-73.82) F7(73.82,-73.82) F8(103.35,-73.82)
Top Overlay:
  circle w0: c-129.92,101.38 r11.81
  lines w8: -155.51,-126.97 155.51,-126.97 155.51,126.97 -155.51,126.97 -155.51,-126.97

## UBGA56 [mm]
pads (54):
  rrect100% 0.36x0.36 smd: A2(-1.875,3) A3(-1.125,3) A4(-0.375,3) A5(0.375,3) A6(1.125,3) A7(1.875,3) B1(-2.625,2.25) B2(-1.875,2.25) B3(-1.125,2.25) B4(-0.375,2.25) B5(0.375,2.25) B6(1.125,2.25) B7(1.875,2.25) B8(2.625,2.25) C1(-2.625,1.5) C2(-1.875,1.5) C3(-1.125,1.5) C4(-0.375,1.5) C5(0.375,1.5) C6(1.125,1.5) C7(1.875,1.5) C8(2.625,1.5) D1(-2.625,0.75) D2(-1.875,0.75) D3(-1.125,0.75) D6(1.125,0.75) D7(1.875,0.75) D8(2.625,0.75) F1(-2.625,-0.75) F3(-1.125,-0.75) F6(1.125,-0.75) F8(2.625,-0.75) G1(-2.625,-1.5) G2(-1.875,-1.5) G3(-1.125,-1.5) G4(-0.375,-1.5) G5(0.375,-1.5) G6(1.125,-1.5) G7(1.875,-1.5) G8(2.625,-1.5) H1(-2.625,-2.25) H2(-1.875,-2.25) H3(-1.125,-2.25) H4(-0.375,-2.25) H5(0.375,-2.25) H6(1.125,-2.25) H7(1.875,-2.25) H8(2.625,-2.25) I2(-1.875,-3) I3(-1.125,-3) I4(-0.375,-3) I5(0.375,-3) I6(1.125,-3) I7(1.875,-3)
Top Overlay:
  circle w0: c-3.1,3.225 r0.3
  lines w0.203: -3.75,-8.125 3.75,-8.125 3.75,8.125 -3.75,8.125 -3.75,-8.125

## UBGA56-1 [mil]
pads (56):
  rrect100% 14.17x14.17 smd: A1(-132.87,73.82) A2(-103.35,73.82) A4(-44.29,73.82) A5(-14.76,73.82) A6(14.76,73.82) A7(44.29,73.82) A9(103.35,73.82) A10(132.87,73.82) B1(-132.87,44.29) B2(-103.35,44.29) B3(-73.82,44.29) B4(-44.29,44.29) B5(-14.76,44.29) B6(14.76,44.29) B7(44.29,44.29) B8(73.82,44.29) B9(103.35,44.29) B10(132.87,44.29) C1(-132.87,14.76) C2(-103.35,14.76) C3(-73.82,14.76) C4(-44.29,14.76) C5(-14.76,14.76) C6(14.76,14.76) C7(44.29,14.76) C8(73.82,14.76) C9(103.35,14.76) C10(132.87,14.76) D1(-132.87,-14.76) D2(-103.35,-14.76) D3(-73.82,-14.76) D4(-44.29,-14.76) D5(-14.76,-14.76) D6(14.76,-14.76) D7(44.29,-14.76) D8(73.82,-14.76) D9(103.35,-14.76) D10(132.87,-14.76) E1(-132.87,-44.29) E2(-103.35,-44.29) E3(-73.82,-44.29) E4(-44.29,-44.29) E5(-14.76,-44.29) E6(14.76,-44.29) E7(44.29,-44.29) E8(73.82,-44.29) E9(103.35,-44.29) E10(132.87,-44.29) F1(-132.87,-73.82) F2(-103.35,-73.82) F3(-73.82,-73.82) F4(-44.29,-73.82) F7(44.29,-73.82) F8(73.82,-73.82) F9(103.35,-73.82) F10(132.87,-73.82)
Top Overlay:
  circle w0: c-133.86,128.94 r11.81
  lines w8: -155.51,-197.83 155.51,-197.83 155.51,197.83 -155.51,197.83 -155.51,-197.83

## UBGA56-2 [mm]
pads (54):
  rrect100% 0.36x0.36 smd: A2(-1.875,3) A3(-1.125,3) A4(-0.375,3) A5(0.375,3) A6(1.125,3) A7(1.875,3) B1(-2.625,2.25) B2(-1.875,2.25) B3(-1.125,2.25) B4(-0.375,2.25) B5(0.375,2.25) B6(1.125,2.25) B7(1.875,2.25) B8(2.625,2.25) C1(-2.625,1.5) C2(-1.875,1.5) C3(-1.125,1.5) C4(-0.375,1.5) C5(0.375,1.5) C6(1.125,1.5) C7(1.875,1.5) C8(2.625,1.5) D1(-2.625,0.75) D2(-1.875,0.75) D3(-1.125,0.75) D6(1.125,0.75) D7(1.875,0.75) D8(2.625,0.75) F1(-2.625,-0.75) F3(-1.125,-0.75) F6(1.125,-0.75) F8(2.625,-0.75) G1(-2.625,-1.5) G2(-1.875,-1.5) G3(-1.125,-1.5) G4(-0.375,-1.5) G5(0.375,-1.5) G6(1.125,-1.5) G7(1.875,-1.5) G8(2.625,-1.5) H1(-2.625,-2.25) H2(-1.875,-2.25) H3(-1.125,-2.25) H4(-0.375,-2.25) H5(0.375,-2.25) H6(1.125,-2.25) H7(1.875,-2.25) H8(2.625,-2.25) I2(-1.875,-3) I3(-1.125,-3) I4(-0.375,-3) I5(0.375,-3) I6(1.125,-3) I7(1.875,-3)
Top Overlay:
  circle w0: c-3.1,3.525 r0.3
  lines w0.203: -4.35,-8.125 4.35,-8.125 4.35,8.125 -4.35,8.125 -4.35,-8.125

## UBGA4008 [mil]
pads (40):
  rrect100% 14.17x14.17 smd: A1(-103.35,59.06) A2(-73.82,59.06) A3(-44.29,59.06) A4(-14.76,59.06) A5(14.76,59.06) A6(44.29,59.06) A7(73.82,59.06) A8(103.35,59.06) B1(-103.35,29.53) B2(-73.82,29.53) B3(-44.29,29.53) B4(-14.76,29.53) B5(14.76,29.53) B6(44.29,29.53) B7(73.82,29.53) B8(103.35,29.53) C1(-103.35,0) C2(-73.82,0) C3(-44.29,0) C4(-14.76,0) C5(14.76,0) C6(44.29,0) C7(73.82,0) C8(103.35,0) D1(-103.35,-29.53) D2(-73.82,-29.53) D3(-44.29,-29.53) D4(-14.76,-29.53) D5(14.76,-29.53) D6(44.29,-29.53) D7(73.82,-29.53) D8(103.35,-29.53) E1(-103.35,-59.06) E2(-73.82,-59.06) E3(-44.29,-59.06) E4(-14.76,-59.06) E5(14.76,-59.06) E6(44.29,-59.06) E7(73.82,-59.06) E8(103.35,-59.06)
Top Overlay:
  circle w0: c-125.98,70.87 r11.81
  lines w8: -143.7,-88.58 143.7,-88.58 143.7,88.58 -143.7,88.58 -143.7,-88.58